# Altium footprint library SMT.PcbLib: 325 footprints (part 17 of 21)
Each footprint in its own frame and in the unit in brackets; x right, y up, seen from the top. Pads: shape width x height; smd on the part's side, far side on the other; paste and mask are expansions set on the pad; w line width, h text height; cw(c..) or ccw(c..) is an arc to the next point about the centre after c.
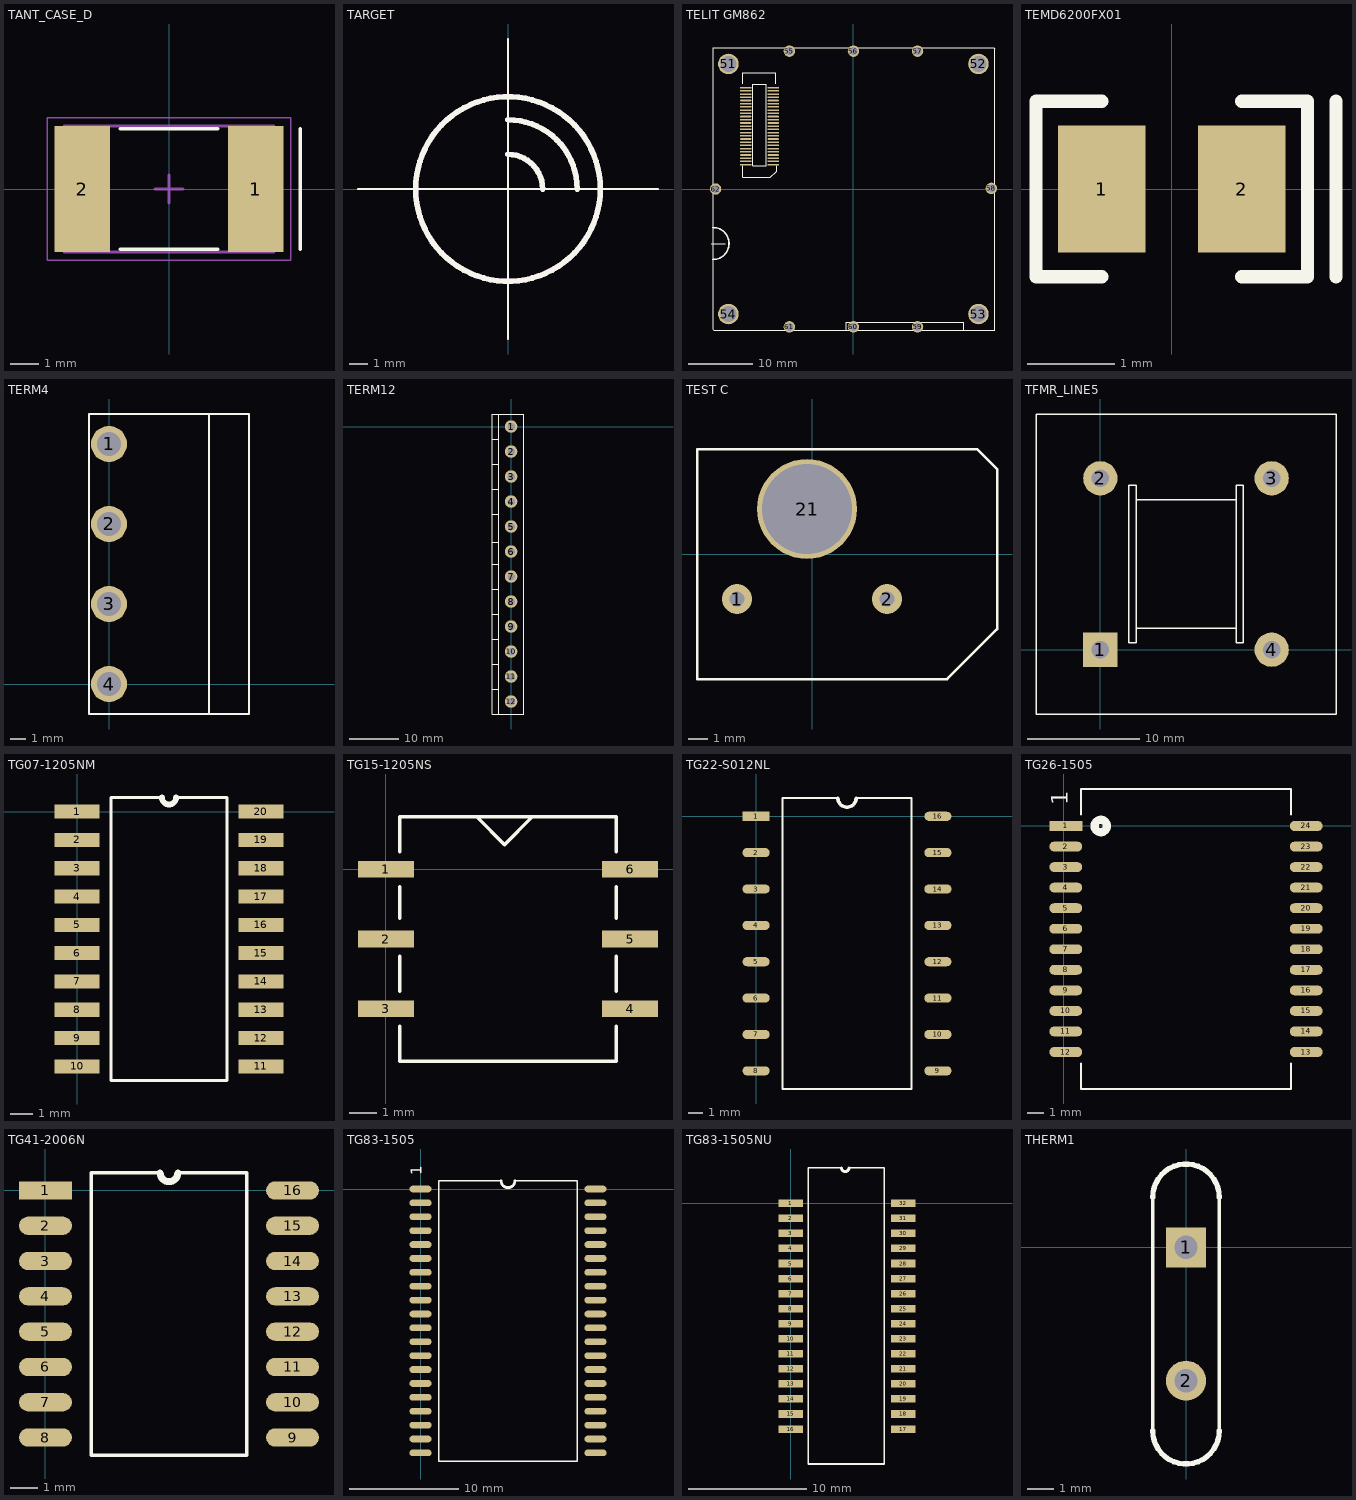
[diagram p16: the footprints below, top view; thin cyan lines are the x and y axes]

## TANT_CASE_D [mm]
pads (2):
  rect 1.99x4.52 smd: 1(3.105,0) 2(-3.105,0)
TopOverlay:
  lines w0.127: -1.75,-2.16 1.75,-2.16 ; -1.75,2.16 1.75,2.16 ; 4.699,-2.159 4.699,2.159
Mechanical13:
  lines w0.1: -3.75,-2.25 -3.75,2.25 3.75,2.25 3.75,-2.25 -3.75,-2.25
Mechanical15:
  lines w0.05: -4.35,-2.55 -4.35,2.55 4.35,2.55 4.35,-2.55 -4.35,-2.55
  lines w0.1: -0.5,0 0.5,0 ; 0,-0.5 0,0.5
3D body: height 3.1, standoff 0, extent -2.45,-2.25 2.45,2.25
3D body: height 3.1, standoff 0, extent -3.75,-2.25 -2.45,2.25
3D body: height 3.1, standoff 0, extent 2.45,-2.25 3.75,2.25

## TARGET [mm]
TopOverlay:
  circle w0.305: c0,0 r5.08
  lines w0.127: -8.255,0 8.255,0 ; 0,-8.255 0,8.255
  lines w0.305: 0,1.905 cw(c0,0) 1.905,0 ; 0,3.81 cw(c0,0) 3.81,0
BottomOverlay:
  circle w0.305: c0,0 r5.08
  lines w0.127: -8.255,0 8.255,0 ; 0,-8.255 0,8.255
  lines w0.305: 0,1.905 cw(c0,0) 1.905,0 ; 0,3.81 cw(c0,0) 3.81,0
Mechanical1:
  circle w0.305: c0,0 r5.08
  lines w0.127: -8.255,0 8.255,0 ; 0,-8.255 0,8.255
  lines w0.305: 0,1.905 cw(c0,0) 1.905,0 ; 0,3.81 cw(c0,0) 3.81,0

## TELIT GM862 [mm]
pads (62):
  rect 1.8x0.25 smd: 1(-12.5,3.8)
  oval 1.8x0.25 smd: 2(-16.8,3.8) 3(-12.5,4.3) 4(-16.8,4.3) 5(-12.5,4.8) 6(-16.8,4.8) 7(-12.5,5.3) 8(-16.8,5.3) 9(-12.5,5.8) 10(-16.8,5.8) 11(-12.5,6.3) 12(-16.8,6.3) 13(-12.5,6.8) 14(-16.8,6.8) 15(-12.5,7.3) 16(-16.8,7.3) 17(-12.5,7.8) 18(-16.8,7.8) 19(-12.5,8.3) 20(-16.8,8.3) 21(-12.5,8.8) 22(-16.8,8.8) 23(-12.5,9.3) 24(-16.8,9.3) 25(-12.5,9.8) 26(-16.8,9.8) 27(-12.5,10.3) 28(-16.8,10.3) 29(-12.5,10.8) 30(-16.8,10.8) 31(-12.5,11.3) 32(-16.8,11.3) 33(-12.5,11.8) 34(-16.8,11.8) 35(-12.5,12.3) 36(-16.8,12.3) 37(-12.5,12.8) 38(-16.8,12.8) 39(-12.5,13.3) 40(-16.8,13.3) 41(-12.5,13.8) 42(-16.8,13.8) 43(-12.5,14.3) 44(-16.8,14.3) 45(-12.5,14.8) 46(-16.8,14.8) 47(-12.5,15.3) 48(-16.8,15.3) 49(-12.5,15.8) 50(-16.8,15.8)
  round 3.2 hole 2.54: 51(-19.5,19.5) 52(19.5,19.5) 53(19.5,-19.5) 54(-19.5,-19.5)
  round 1.778 hole 1.245: 55(-10,21.5) 56(0,21.5) 57(10,21.5) 58(21.5,0.1) 59(10,-21.5) 60(0,-21.5) 61(-10,-21.5) 62(-21.5,0)
TopOverlay:
  lines w0.127: -22.2,-8.5 -20,-8.5 ; -17.3,3.6 -17.3,1.8 -13,1.8 -12,2.8 -12,3.6 ; -17.3,16.4 -17.3,18.1 -12.1,18.1 -12.1,16.4 ; -1.1,-22 -1.1,-20.8 17.2,-20.8 17.2,-22 ; -21.9,-21.9 -21.9,22 21.9,22 22,21.9 22,-22 -21.8,-22 -21.9,-21.9 ; -15.7,3.6 -15.7,16.3 -13.6,16.3 -13.6,3.6 -15.7,3.6
  lines w0.254: -21.9,-11 ccw(c-21.9,-8.5) -21.9,-6

## TEMD6200FX01 [mm] "VISHAY AMBIENTLIGHT SENSOR"
height 0.85
pads (2):
  rect 1x1.45 smd: 1(-0.8,0) 2(0.8,0)
TopOverlay:
  lines w0.152: -0.8,-1 -1.55,-1 -1.55,1 -0.8,1 ; 0.8,-1 1.55,-1 1.55,1 0.8,1 ; 1.875,-1 1.875,1
3D body: height 0.85, standoff 0, extent -1,-0.625 1,0.625

## TERM4 [mil]
pads (4):
  round 90 hole 60: 1(0,600) 2(0,400) 3(0,200) 4(0,0)
TopOverlay:
  lines w5: 250,-75 250,675 ; -50,-75 350,-75 350,675 -50,675 -50,-75

## TERM12 [mil]
pads (12):
  round 100 hole 60: 1(0,0) 2(0,-200) 3(0,-400) 4(0,-600) 5(0,-800) 6(0,-1000) 7(0,-1200) 8(0,-1400) 9(0,-1600) 10(0,-1800) 11(0,-2000) 12(0,-2200)
TopOverlay:
  lines w5: -150,-2100 -100,-2100 ; -150,-1900 -100,-1900 ; -150,-1700 -100,-1700 ; -150,-1300 -100,-1300 ; -150,-1100 -100,-1100 ; -150,-925 -100,-925 ; -150,-500 -100,-500 ; -150,-300 -100,-300 ; -150,-100 -100,-100 ; -100,100 -100,-700 ; -150,-2300 100,-2300 100,100 -150,100 -150,-700 ; -150,-2300 -100,-2300 ; -150,-2300 -100,-2300 ; -150,-2300 -100,-2300 ; -150,-2300 -150,-1500 ; -150,-1500 -100,-1500 ; -150,-1500 -150,-700 ; -150,-700 -100,-700 ; -100,-2300 -100,-1500 ; -100,-1500 -100,-700

## TEST C [mil]
pads (3):
  round 60 hole 30: 1(-150,-90) 2(150,-90)
  round 200 hole 180: 21(-10,90)
TopOverlay:
  lines w5: -230,-250 -230,210 330,210 370,170 370,-150 270,-250 -230,-250

## TFMR_LINE5 [mil]
pads (4):
  rect 120x120 hole 60: 1(0,0)
  round 120 hole 60: 2(0,600) 3(600,600) 4(600,0)
TopOverlay:
  lines w5: -225,-225 825,-225 825,825 -225,825 -225,-225 ; 100,25 125,25 125,575 100,575 100,25 ; 125,75 475,75 475,525 125,525 125,75 ; 475,25 500,25 500,575 475,575 475,25

## TG07-1205NM [mil]
pads (20):
  rect 80x25 smd: 1(0,0) 2(0,-50) 3(0,-100) 4(0,-150) 5(0,-200) 6(0,-250) 7(0,-300) 8(0,-350) 9(0,-400) 10(0,-450) 11(325,-450) 12(325,-400) 13(325,-350) 14(325,-300) 15(325,-250) 16(325,-200) 17(325,-150) 18(325,-100) 19(325,-50) 20(325,0)
TopOverlay:
  lines w5: 150,25 60,25 60,-475 265,-475 265,25 175,25
  lines w10: 150,25 ccw(c162.5,25) 175,25

## TG15-1205NS [mil]
pads (6):
  rect 80x24 smd: 1(0,0) 2(0,-100) 3(0,-200) 4(350,-200) 5(350,-100) 6(350,0)
TopOverlay:
  lines w5: 20,-225 20,-275 330,-275 330,-225 ; 20,-175 20,-125 ; 20,-70 20,-25 ; 20,25 20,75 330,75 330,25 ; 130,75 170,35 210,75 ; 330,-175 330,-125 ; 330,-70 330,-25

## TG22-S012NL [mm]
pads (16):
  rect 1.905x0.635 smd: 1(0,0)
  oval 1.905x0.635 smd: 2(0,-2.54) 3(0,-5.08) 4(0,-7.62) 5(0,-10.16) 6(0,-12.7) 7(0,-15.24) 8(0,-17.78) 9(12.7,-17.78) 10(12.7,-15.24) 11(12.7,-12.7) 12(12.7,-10.16) 13(12.7,-7.62) 14(12.7,-5.08) 15(12.7,-2.54) 16(12.7,0)
TopOverlay:
  lines w0.127: 5.715,1.27 1.841,1.27 1.841,-19.05 10.858,-19.05 10.858,1.27 6.985,1.27
  lines w0.254: 5.715,1.27 ccw(c6.35,1.27) 6.985,1.27

## TG26-1505 [mil]
pads (24):
  rect 80x24 smd: 1(5,0)
  oval 80x24 smd: 2(4.75,-50) 3(4.75,-100) 4(4.75,-150) 5(4.75,-200) 6(4.75,-250) 7(4.75,-300) 8(4.75,-350) 9(4.75,-400) 10(4.75,-450) 11(4.75,-500) 12(4.75,-550) 13(589.75,-550) 14(589.75,-500) 15(589.75,-450) 16(589.75,-400) 17(589.75,-350) 18(589.75,-300) 19(589.75,-250) 20(589.75,-200) 21(589.75,-150) 22(589.75,-100) 23(589.75,-50) 24(589.75,0)
TopOverlay:
  circle w20: c89.75,0 r15
  lines w5: 42.25,-577.5 42.25,-640 552.25,-640 552.25,-577.5 ; 42.25,27.5 42.25,90 552.25,90 552.25,27.5
  text "1" at 10,50 h40

## TG41-2006N [mil]
pads (16):
  rect 75x26 smd: 1(0,0)
  oval 75x26 smd: 2(0,-50) 3(0,-100) 4(0,-150) 5(0,-200) 6(0,-250) 7(0,-300) 8(0,-350) 9(350,-350) 10(350,-300) 11(350,-250) 12(350,-200) 13(350,-150) 14(350,-100) 15(350,-50) 16(350,0)
TopOverlay:
  lines w5: 162.5,25 65,25 65,-375 285,-375 285,25 187.5,25
  lines w10: 162.5,25 ccw(c175,25) 187.5,25

## TG83-1505 [mil]
pads (40):
  oval 80x24 smd: 1(0,0) 2(0,-50) 3(0,-100) 4(0,-150) 5(0,-200) 6(0,-250) 7(0,-300) 8(0,-350) 9(0,-400) 10(0,-450) 11(0,-500) 12(0,-550) 13(0,-600) 14(0,-650) 15(0,-700) 16(0,-750) 17(0,-800) 18(0,-850) 19(0,-900) 20(0,-950) 21(630,-950) 22(630,-900) 23(630,-850) 24(630,-800) 25(630,-750) 26(630,-700) 27(630,-650) 28(630,-600) 29(630,-550) 30(630,-500) 31(630,-450) 32(630,-400) 33(630,-350) 34(630,-300) 35(630,-250) 36(630,-200) 37(630,-150) 38(630,-100) 39(630,-50) 40(630,0)
TopOverlay:
  lines w5: 290,30 65,30 65,-980 565,-980 565,30 340,30
  lines w10: 290,30 ccw(c315,30) 340,30
  text "1" at 5,50 h40

## TG83-1505NU [mil]
pads (32):
  rect 80x25 smd: 1(0,0) 2(0,-50) 3(0,-100) 4(0,-150) 5(0,-200) 6(0,-250) 7(0,-300) 8(0,-350) 9(0,-400) 10(0,-450) 11(0,-500) 12(0,-550) 13(0,-600) 14(0,-650) 15(0,-700) 16(0,-750) 17(374.02,-750) 18(374.02,-700) 19(374.02,-650) 20(374.02,-600) 21(374.02,-550) 22(374.02,-500) 23(374.02,-450) 24(374.02,-400) 25(374.02,-350) 26(374.02,-300) 27(374.02,-250) 28(374.02,-200) 29(374.02,-150) 30(374.02,-100) 31(374.02,-50) 32(374.02,0)
TopOverlay:
  lines w5: 168.6,118.11 59.05,118.11 59.05,-866.14 311.02,-866.14 311.02,118.11 192.91,118.11
  lines w10: 168.6,118.11 ccw(c181.1,118.11) 193.6,118.11

## THERM1 [mil]
pads (2):
  rect 60x60 hole 35: 1(0,0)
  round 60 hole 35: 2(0,-200)
TopOverlay:
  lines w5: -50,-275 -50,75 ; 50,-275 50,75
  lines w8: -50,-275 ccw(c0,-275) 50,-275 ; -50,75 cw(c0,75) 50,75